# Altium footprint library Kon_Tipk.PCBLIB: 113 footprints (part 5 of 8)
Each footprint in its own frame and in the unit in brackets; x right, y up, seen from the top. Pads: shape width x height; smd on the part's side, far side on the other; paste and mask are expansions set on the pad; w line width, h text height; cw(c..) or ccw(c..) is an arc to the next point about the centre after c.
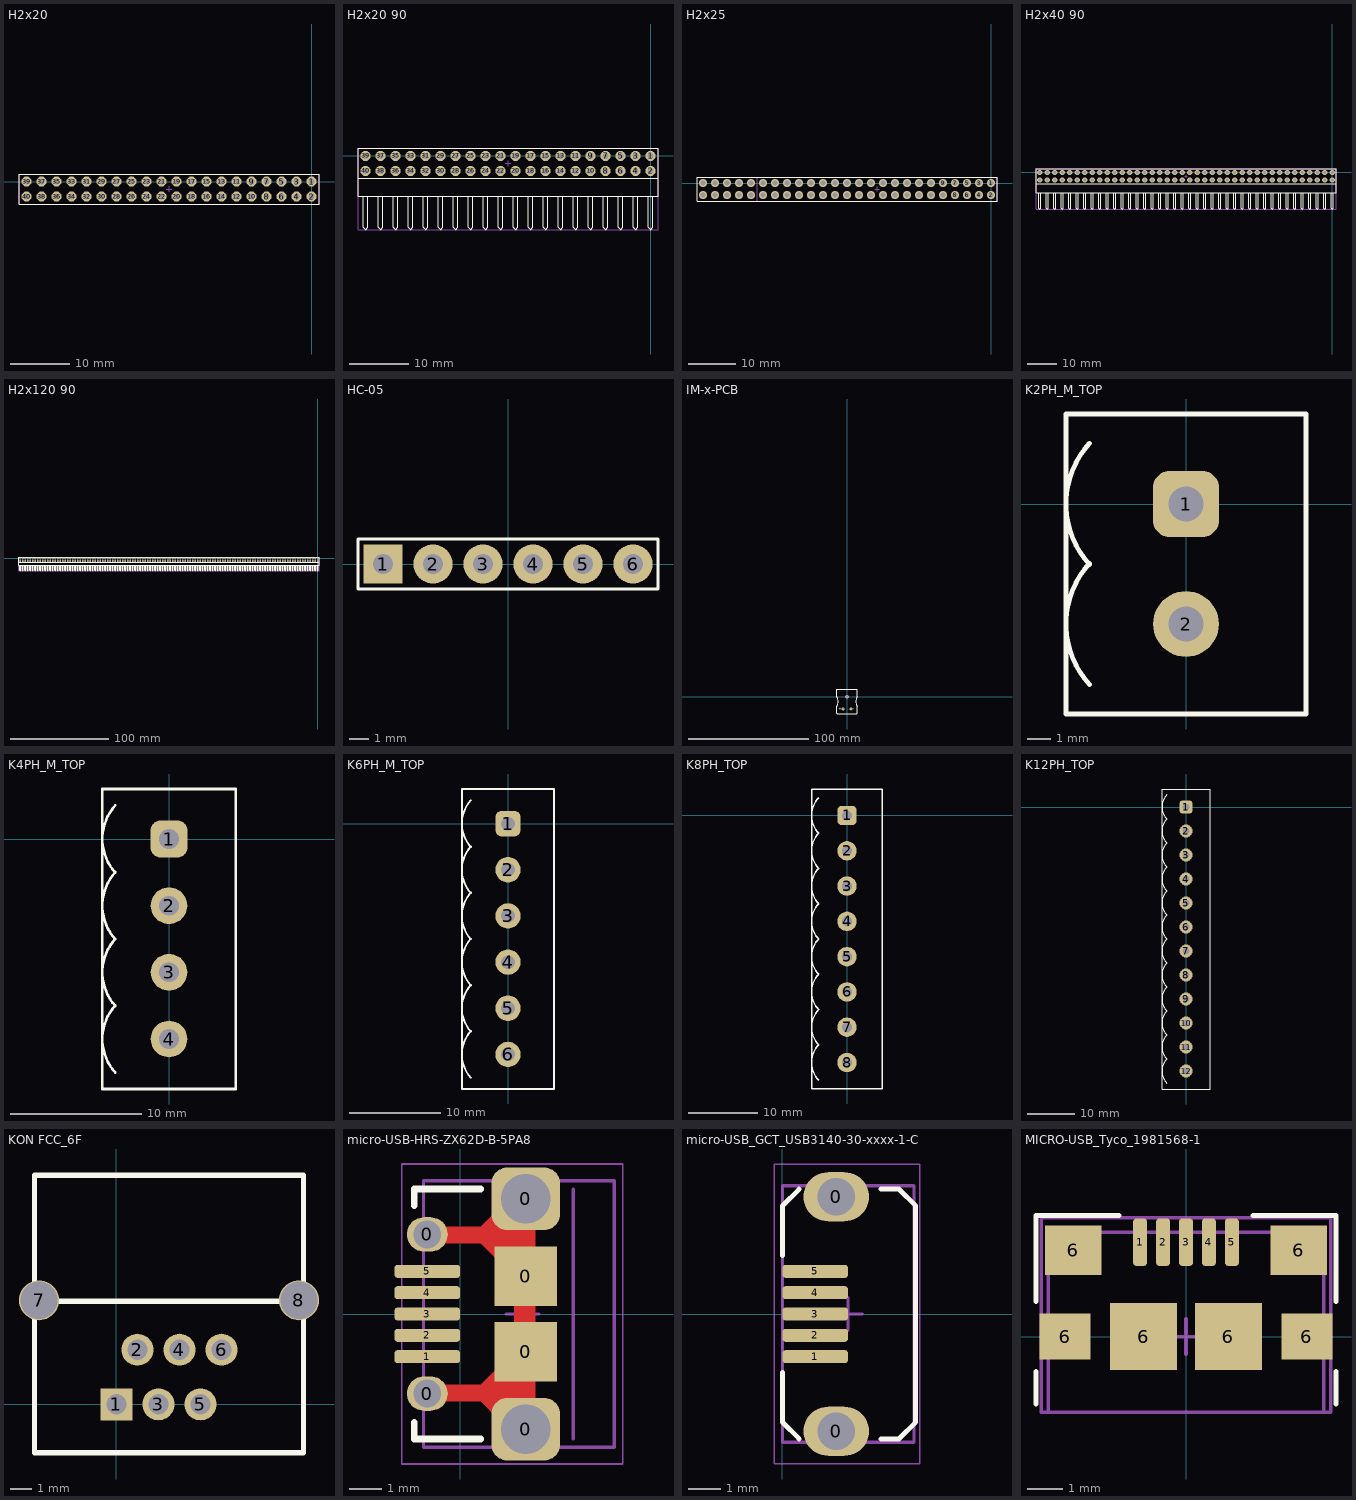
[diagram p4: the footprints below, top view; thin cyan lines are the x and y axes]

## H2x20 [mm]
height 8
pads (40):
  round 1.75 hole 1: 1(0,0) 2(0,-2.54) 3(-2.54,0) 4(-2.54,-2.54) 5(-5.08,0) 6(-5.08,-2.54) 7(-7.62,0) 8(-7.62,-2.54) 9(-10.16,0) 10(-10.16,-2.54) 11(-12.7,0) 12(-12.7,-2.54) 13(-15.24,0) 14(-15.24,-2.54) 15(-17.78,0) 16(-17.78,-2.54) 17(-20.32,0) 18(-20.32,-2.54) 19(-22.86,0) 20(-22.86,-2.54) 21(-25.4,0) 22(-25.4,-2.54) 23(-27.94,0) 24(-27.94,-2.54) 25(-30.48,0) 26(-30.48,-2.54) 27(-33.02,0) 28(-33.02,-2.54) 29(-35.56,0) 30(-35.56,-2.54) 31(-38.1,0) 32(-38.1,-2.54) 33(-40.64,0) 34(-40.64,-2.54) 35(-43.18,0) 36(-43.18,-2.54) 37(-45.72,0) 38(-45.72,-2.54) 39(-48.26,0) 40(-48.26,-2.54)
Top Overlay:
  lines w0.2: -49.53,-3.81 -49.53,1.27 1.27,1.27 1.27,-3.81 -49.53,-3.81
Mechanical 13:
  lines w0.1: -49.53,-3.81 -49.53,1.27 1.27,1.27 1.27,-3.81 -49.53,-3.81
Top Courtyard:
  lines w0.1: -24.63,-1.27 -23.63,-1.27 ; -24.13,-1.77 -24.13,-0.77 ; -49.53,-3.81 1.27,-3.81 1.27,1.27 -49.53,1.27 -49.53,-3.81
3D body "Samtec-TSW-101-07-G-D.step": height 8.4, standoff -2.52, extent -3.81,-3.81 -1.27,1.27
3D body "Samtec-TSW-101-07-G-D.step": height 8.4, standoff -2.52, extent -6.35,-3.81 -3.81,1.27
3D body "Samtec-TSW-101-07-G-D.step": height 8.4, standoff -2.52, extent -1.27,-3.81 1.27,1.27
3D body "Samtec-TSW-101-07-G-D.step": height 8.4, standoff -2.52, extent -8.89,-3.81 -6.35,1.27
3D body "Samtec-TSW-101-07-G-D.step": height 8.4, standoff -2.52, extent -11.43,-3.81 -8.89,1.27
3D body "Samtec-TSW-101-07-G-D.step": height 8.4, standoff -2.52, extent -13.97,-3.81 -11.43,1.27
3D body "Samtec-TSW-101-07-G-D.step": height 8.4, standoff -2.52, extent -16.51,-3.81 -13.97,1.27
3D body "Samtec-TSW-101-07-G-D.step": height 8.4, standoff -2.52, extent -19.05,-3.81 -16.51,1.27
3D body "Samtec-TSW-101-07-G-D.step": height 8.4, standoff -2.52, extent -21.59,-3.81 -19.05,1.27
3D body "Samtec-TSW-101-07-G-D.step": height 8.4, standoff -2.52, extent -24.13,-3.81 -21.59,1.27
3D body "Samtec-TSW-101-07-G-D.step": height 8.4, standoff -2.52, extent -26.67,-3.81 -24.13,1.27
3D body "Samtec-TSW-101-07-G-D.step": height 8.4, standoff -2.52, extent -29.21,-3.81 -26.67,1.27
3D body "Samtec-TSW-101-07-G-D.step": height 8.4, standoff -2.52, extent -31.75,-3.81 -29.21,1.27
3D body "Samtec-TSW-101-07-G-D.step": height 8.4, standoff -2.52, extent -34.29,-3.81 -31.75,1.27
3D body "Samtec-TSW-101-07-G-D.step": height 8.4, standoff -2.52, extent -36.83,-3.81 -34.29,1.27
3D body "Samtec-TSW-101-07-G-D.step": height 8.4, standoff -2.52, extent -39.37,-3.81 -36.83,1.27
3D body "Samtec-TSW-101-07-G-D.step": height 8.4, standoff -2.52, extent -41.91,-3.81 -39.37,1.27
3D body "Samtec-TSW-101-07-G-D.step": height 8.4, standoff -2.52, extent -44.45,-3.81 -41.91,1.27
3D body "Samtec-TSW-101-07-G-D.step": height 8.4, standoff -2.52, extent -46.99,-3.81 -44.45,1.27
3D body "Samtec-TSW-101-07-G-D.step": height 8.4, standoff -2.52, extent -49.53,-3.81 -46.99,1.27

## H2x20 90 [mm]
height 8
pads (40):
  round 1.75 hole 1: 1(0,0) 2(0,-2.54) 3(-2.54,0) 4(-2.54,-2.54) 5(-5.08,0) 6(-5.08,-2.54) 7(-7.62,0) 8(-7.62,-2.54) 9(-10.16,0) 10(-10.16,-2.54) 11(-12.7,0) 12(-12.7,-2.54) 13(-15.24,0) 14(-15.24,-2.54) 15(-17.78,0) 16(-17.78,-2.54) 17(-20.32,0) 18(-20.32,-2.54) 19(-22.86,0) 20(-22.86,-2.54) 21(-25.4,0) 22(-25.4,-2.54) 23(-27.94,0) 24(-27.94,-2.54) 25(-30.48,0) 26(-30.48,-2.54) 27(-33.02,0) 28(-33.02,-2.54) 29(-35.56,0) 30(-35.56,-2.54) 31(-38.1,0) 32(-38.1,-2.54) 33(-40.64,0) 34(-40.64,-2.54) 35(-43.18,0) 36(-43.18,-2.54) 37(-45.72,0) 38(-45.72,-2.54) 39(-48.26,0) 40(-48.26,-2.54)
Top Overlay:
  lines w0.2: -49.53,-3.81 1.27,-3.81 ; -48.641,-6.858 -48.641,-12.078 -48.26,-12.459 -47.879,-12.078 -47.879,-6.858 ; -46.101,-6.858 -46.101,-12.078 -45.72,-12.459 -45.339,-12.078 -45.339,-6.858 ; -43.561,-6.858 -43.561,-12.078 -43.18,-12.459 -42.799,-12.078 -42.799,-6.858 ; -41.021,-6.858 -41.021,-12.078 -40.64,-12.459 -40.259,-12.078 -40.259,-6.858 ; -38.481,-6.858 -38.481,-12.078 -38.1,-12.459 -37.719,-12.078 -37.719,-6.858 ; -35.941,-6.858 -35.941,-12.078 -35.56,-12.459 -35.179,-12.078 -35.179,-6.858 ; -33.401,-6.858 -33.401,-12.078 -33.02,-12.459 -32.639,-12.078 -32.639,-6.858 ; -30.861,-6.858 -30.861,-12.078 -30.48,-12.459 -30.099,-12.078 -30.099,-6.858 ; -28.321,-6.858 -28.321,-12.078 -27.94,-12.459 -27.559,-12.078 -27.559,-6.858 ; -25.781,-6.858 -25.781,-12.078 -25.4,-12.459 -25.019,-12.078 -25.019,-6.858 ; -23.241,-6.858 -23.241,-12.078 -22.86,-12.459 -22.479,-12.078 -22.479,-6.858 ; -20.701,-6.858 -20.701,-12.078 -20.32,-12.459 -19.939,-12.078 -19.939,-6.858 ; -18.161,-6.858 -18.161,-12.078 -17.78,-12.459 -17.399,-12.078 -17.399,-6.858 ; -15.621,-6.858 -15.621,-12.078 -15.24,-12.459 -14.859,-12.078 -14.859,-6.858 ; -13.081,-6.858 -13.081,-12.078 -12.7,-12.459 -12.319,-12.078 -12.319,-6.858 ; -10.541,-6.858 -10.541,-12.078 -10.16,-12.459 -9.779,-12.078 -9.779,-6.858 ; -8.001,-6.858 -8.001,-12.078 -7.62,-12.459 -7.239,-12.078 -7.239,-6.858 ; -5.461,-6.858 -5.461,-12.078 -5.08,-12.459 -4.699,-12.078 -4.699,-6.858 ; -2.921,-6.858 -2.921,-12.078 -2.54,-12.459 -2.159,-12.078 -2.159,-6.858 ; -0.381,-6.858 -0.381,-12.078 0,-12.459 0.381,-12.078 0.381,-6.858 ; -49.53,-6.858 1.27,-6.858 1.27,1.27 -49.53,1.27 -49.53,-6.858
Mechanical 13:
  lines w0.1: -49.53,-12.459 1.27,-12.459 1.27,1.27 -49.53,1.27 -49.53,-12.459
Top Courtyard:
  lines w0.1: -24.63,-1.27 -23.63,-1.27 ; -24.13,-1.77 -24.13,-0.77 ; -49.53,-12.459 1.27,-12.459 1.27,1.27 -49.53,1.27 -49.53,-12.459
3D body "Samtec-TSW-101-08-G-D-RA.step": height 5.6, standoff -2.27, extent -3.81,-12.459 -1.27,0.305
3D body "Samtec-TSW-101-08-G-D-RA.step": height 5.6, standoff -2.27, extent -1.27,-12.459 1.27,0.305
3D body "Samtec-TSW-101-08-G-D-RA.step": height 5.6, standoff -2.27, extent -6.35,-12.459 -3.81,0.305
3D body "Samtec-TSW-101-08-G-D-RA.step": height 5.6, standoff -2.27, extent -8.89,-12.459 -6.35,0.305
3D body "Samtec-TSW-101-08-G-D-RA.step": height 5.6, standoff -2.27, extent -11.43,-12.459 -8.89,0.305
3D body "Samtec-TSW-101-08-G-D-RA.step": height 5.6, standoff -2.27, extent -13.97,-12.459 -11.43,0.305
3D body "Samtec-TSW-101-08-G-D-RA.step": height 5.6, standoff -2.27, extent -16.51,-12.459 -13.97,0.305
3D body "Samtec-TSW-101-08-G-D-RA.step": height 5.6, standoff -2.27, extent -19.05,-12.459 -16.51,0.305
3D body "Samtec-TSW-101-08-G-D-RA.step": height 5.6, standoff -2.27, extent -21.59,-12.459 -19.05,0.305
3D body "Samtec-TSW-101-08-G-D-RA.step": height 5.6, standoff -2.27, extent -24.13,-12.459 -21.59,0.305
3D body "Samtec-TSW-101-08-G-D-RA.step": height 5.6, standoff -2.27, extent -26.67,-12.459 -24.13,0.305
3D body "Samtec-TSW-101-08-G-D-RA.step": height 5.6, standoff -2.27, extent -29.21,-12.459 -26.67,0.305
3D body "Samtec-TSW-101-08-G-D-RA.step": height 5.6, standoff -2.27, extent -31.75,-12.459 -29.21,0.305
3D body "Samtec-TSW-101-08-G-D-RA.step": height 5.6, standoff -2.27, extent -34.29,-12.459 -31.75,0.305
3D body "Samtec-TSW-101-08-G-D-RA.step": height 5.6, standoff -2.27, extent -36.83,-12.459 -34.29,0.305
3D body "Samtec-TSW-101-08-G-D-RA.step": height 5.6, standoff -2.27, extent -39.37,-12.459 -36.83,0.305
3D body "Samtec-TSW-101-08-G-D-RA.step": height 5.6, standoff -2.27, extent -41.91,-12.459 -39.37,0.305
3D body "Samtec-TSW-101-08-G-D-RA.step": height 5.6, standoff -2.27, extent -44.45,-12.459 -41.91,0.305
3D body "Samtec-TSW-101-08-G-D-RA.step": height 5.6, standoff -2.27, extent -46.99,-12.459 -44.45,0.305
3D body "Samtec-TSW-101-08-G-D-RA.step": height 5.6, standoff -2.27, extent -49.53,-12.459 -46.99,0.305

## H2x25 [mm]
height 8
pads (50):
  round 1.75 hole 1: 1(0,0) 2(0,-2.54) 3(-2.54,0) 4(-2.54,-2.54) 5(-5.08,0) 6(-5.08,-2.54) 7(-7.62,0) 8(-7.62,-2.54) 9(-10.16,0) 10(-10.16,-2.54) 11(-12.7,0) 12(-12.7,-2.54) 13(-15.24,0) 14(-15.24,-2.54) 15(-17.78,0) 16(-17.78,-2.54) 17(-20.32,0) 18(-20.32,-2.54) 19(-22.86,0) 20(-22.86,-2.54) 21(-25.4,0) 22(-25.4,-2.54) 23(-27.94,0) 24(-27.94,-2.54) 25(-30.48,0) 26(-30.48,-2.54) 27(-33.02,0) 28(-33.02,-2.54) 29(-35.56,0) 30(-35.56,-2.54) 31(-38.1,0) 32(-38.1,-2.54) 33(-40.64,0) 34(-40.64,-2.54) 35(-43.18,0) 36(-43.18,-2.54) 37(-45.72,0) 38(-45.72,-2.54) 39(-48.26,0) 40(-48.26,-2.54) 41(-50.8,0) 42(-50.8,-2.54) 43(-53.34,0) 44(-53.34,-2.54) 45(-55.88,0) 46(-55.88,-2.54) 47(-58.42,0) 48(-58.42,-2.54) 49(-60.96,0) 50(-60.96,-2.54)
Top Overlay:
  lines w0.2: -62.23,-3.81 -62.23,1.27 1.27,1.27 1.27,-3.81 -62.23,-3.81
Mechanical 13:
  lines w0.1: -49.53,-3.81 -49.53,1.27 1.27,1.27 1.27,-3.81 -49.53,-3.81
Top Courtyard:
  lines w0.1: -24.63,-1.27 -23.63,-1.27 ; -24.13,-1.77 -24.13,-0.77 ; -49.53,-3.81 1.27,-3.81 1.27,1.27 -49.53,1.27 -49.53,-3.81
3D body "Samtec-TSW-101-07-G-D.step": height 8.4, standoff -2.52, extent -62.23,-3.81 -59.69,1.27
3D body "Samtec-TSW-101-07-G-D.step": height 8.4, standoff -2.52, extent -59.69,-3.81 -57.15,1.27
3D body "Samtec-TSW-101-07-G-D.step": height 8.4, standoff -2.52, extent -57.15,-3.81 -54.61,1.27
3D body "Samtec-TSW-101-07-G-D.step": height 8.4, standoff -2.52, extent -54.61,-3.81 -52.07,1.27
3D body "Samtec-TSW-101-07-G-D.step": height 8.4, standoff -2.52, extent -52.07,-3.81 -49.53,1.27
3D body "Samtec-TSW-101-07-G-D.step": height 8.4, standoff -2.52, extent -3.81,-3.81 -1.27,1.27
3D body "Samtec-TSW-101-07-G-D.step": height 8.4, standoff -2.52, extent -6.35,-3.81 -3.81,1.27
3D body "Samtec-TSW-101-07-G-D.step": height 8.4, standoff -2.52, extent -1.27,-3.81 1.27,1.27
3D body "Samtec-TSW-101-07-G-D.step": height 8.4, standoff -2.52, extent -8.89,-3.81 -6.35,1.27
3D body "Samtec-TSW-101-07-G-D.step": height 8.4, standoff -2.52, extent -11.43,-3.81 -8.89,1.27
3D body "Samtec-TSW-101-07-G-D.step": height 8.4, standoff -2.52, extent -13.97,-3.81 -11.43,1.27
3D body "Samtec-TSW-101-07-G-D.step": height 8.4, standoff -2.52, extent -16.51,-3.81 -13.97,1.27
3D body "Samtec-TSW-101-07-G-D.step": height 8.4, standoff -2.52, extent -19.05,-3.81 -16.51,1.27
3D body "Samtec-TSW-101-07-G-D.step": height 8.4, standoff -2.52, extent -21.59,-3.81 -19.05,1.27
3D body "Samtec-TSW-101-07-G-D.step": height 8.4, standoff -2.52, extent -24.13,-3.81 -21.59,1.27
3D body "Samtec-TSW-101-07-G-D.step": height 8.4, standoff -2.52, extent -26.67,-3.81 -24.13,1.27
3D body "Samtec-TSW-101-07-G-D.step": height 8.4, standoff -2.52, extent -29.21,-3.81 -26.67,1.27
3D body "Samtec-TSW-101-07-G-D.step": height 8.4, standoff -2.52, extent -31.75,-3.81 -29.21,1.27
3D body "Samtec-TSW-101-07-G-D.step": height 8.4, standoff -2.52, extent -34.29,-3.81 -31.75,1.27
3D body "Samtec-TSW-101-07-G-D.step": height 8.4, standoff -2.52, extent -36.83,-3.81 -34.29,1.27
3D body "Samtec-TSW-101-07-G-D.step": height 8.4, standoff -2.52, extent -39.37,-3.81 -36.83,1.27
3D body "Samtec-TSW-101-07-G-D.step": height 8.4, standoff -2.52, extent -41.91,-3.81 -39.37,1.27
3D body "Samtec-TSW-101-07-G-D.step": height 8.4, standoff -2.52, extent -44.45,-3.81 -41.91,1.27
3D body "Samtec-TSW-101-07-G-D.step": height 8.4, standoff -2.52, extent -46.99,-3.81 -44.45,1.27
3D body "Samtec-TSW-101-07-G-D.step": height 8.4, standoff -2.52, extent -49.53,-3.81 -46.99,1.27

## H2x40 90 [mm]
height 8
pads (80):
  round 1.75 hole 1: 1(0,0) 2(0,-2.54) 3(-2.54,0) 4(-2.54,-2.54) 5(-5.08,0) 6(-5.08,-2.54) 7(-7.62,0) 8(-7.62,-2.54) 9(-10.16,0) 10(-10.16,-2.54) 11(-12.7,0) 12(-12.7,-2.54) 13(-15.24,0) 14(-15.24,-2.54) 15(-17.78,0) 16(-17.78,-2.54) 17(-20.32,0) 18(-20.32,-2.54) 19(-22.86,0) 20(-22.86,-2.54) 21(-25.4,0) 22(-25.4,-2.54) 23(-27.94,0) 24(-27.94,-2.54) 25(-30.48,0) 26(-30.48,-2.54) 27(-33.02,0) 28(-33.02,-2.54) 29(-35.56,0) 30(-35.56,-2.54) 31(-38.1,0) 32(-38.1,-2.54) 33(-40.64,0) 34(-40.64,-2.54) 35(-43.18,0) 36(-43.18,-2.54) 37(-45.72,0) 38(-45.72,-2.54) 39(-48.26,0) 40(-48.26,-2.54) 41(-50.8,0) 42(-50.8,-2.54) 43(-53.34,0) 44(-53.34,-2.54) 45(-55.88,0) 46(-55.88,-2.54) 47(-58.42,0) 48(-58.42,-2.54) 49(-60.96,0) 50(-60.96,-2.54) 51(-63.5,0) 52(-63.5,-2.54) 53(-66.04,0) 54(-66.04,-2.54) 55(-68.58,0) 56(-68.58,-2.54) 57(-71.12,0) 58(-71.12,-2.54) 59(-73.66,0) 60(-73.66,-2.54) 61(-76.2,0) 62(-76.2,-2.54) 63(-78.74,0) 64(-78.74,-2.54) 65(-81.28,0) 66(-81.28,-2.54) 67(-83.82,0) 68(-83.82,-2.54) 69(-86.36,0) 70(-86.36,-2.54) 71(-88.9,0) 72(-88.9,-2.54) 73(-91.44,0) 74(-91.44,-2.54) 75(-93.98,0) 76(-93.98,-2.54) 77(-96.52,0) 78(-96.52,-2.54) 79(-99.06,0) 80(-99.06,-2.54)
Top Overlay:
  drawing of 165 lines, arcs and shapes, not listed
Mechanical 13:
  lines w0.1: -100.33,-12.459 1.27,-12.459 1.27,1.27 -100.33,1.27 -100.33,-12.459
Top Courtyard:
  lines w0.1: -50.03,-1.27 -49.03,-1.27 ; -49.53,-1.77 -49.53,-0.77 ; -100.33,-12.459 1.27,-12.459 1.27,1.27 -100.33,1.27 -100.33,-12.459
3D body "Samtec-TSW-101-08-G-D-RA.step": height 5.6, standoff -2.27, extent -3.81,-12.459 -1.27,0.305
3D body "Samtec-TSW-101-08-G-D-RA.step": height 5.6, standoff -2.27, extent -1.27,-12.459 1.27,0.305
3D body "Samtec-TSW-101-08-G-D-RA.step": height 5.6, standoff -2.27, extent -6.35,-12.459 -3.81,0.305
3D body "Samtec-TSW-101-08-G-D-RA.step": height 5.6, standoff -2.27, extent -8.89,-12.459 -6.35,0.305
3D body "Samtec-TSW-101-08-G-D-RA.step": height 5.6, standoff -2.27, extent -11.43,-12.459 -8.89,0.305
3D body "Samtec-TSW-101-08-G-D-RA.step": height 5.6, standoff -2.27, extent -13.97,-12.459 -11.43,0.305
3D body "Samtec-TSW-101-08-G-D-RA.step": height 5.6, standoff -2.27, extent -16.51,-12.459 -13.97,0.305
3D body "Samtec-TSW-101-08-G-D-RA.step": height 5.6, standoff -2.27, extent -19.05,-12.459 -16.51,0.305
3D body "Samtec-TSW-101-08-G-D-RA.step": height 5.6, standoff -2.27, extent -21.59,-12.459 -19.05,0.305
3D body "Samtec-TSW-101-08-G-D-RA.step": height 5.6, standoff -2.27, extent -24.13,-12.459 -21.59,0.305
3D body "Samtec-TSW-101-08-G-D-RA.step": height 5.6, standoff -2.27, extent -26.67,-12.459 -24.13,0.305
3D body "Samtec-TSW-101-08-G-D-RA.step": height 5.6, standoff -2.27, extent -29.21,-12.459 -26.67,0.305
3D body "Samtec-TSW-101-08-G-D-RA.step": height 5.6, standoff -2.27, extent -31.75,-12.459 -29.21,0.305
3D body "Samtec-TSW-101-08-G-D-RA.step": height 5.6, standoff -2.27, extent -34.29,-12.459 -31.75,0.305
3D body "Samtec-TSW-101-08-G-D-RA.step": height 5.6, standoff -2.27, extent -36.83,-12.459 -34.29,0.305
3D body "Samtec-TSW-101-08-G-D-RA.step": height 5.6, standoff -2.27, extent -39.37,-12.459 -36.83,0.305
3D body "Samtec-TSW-101-08-G-D-RA.step": height 5.6, standoff -2.27, extent -41.91,-12.459 -39.37,0.305
3D body "Samtec-TSW-101-08-G-D-RA.step": height 5.6, standoff -2.27, extent -44.45,-12.459 -41.91,0.305
3D body "Samtec-TSW-101-08-G-D-RA.step": height 5.6, standoff -2.27, extent -46.99,-12.459 -44.45,0.305
3D body "Samtec-TSW-101-08-G-D-RA.step": height 5.6, standoff -2.27, extent -49.53,-12.459 -46.99,0.305
3D body "Samtec-TSW-101-08-G-D-RA.step": height 5.6, standoff -2.27, extent -52.07,-12.459 -49.53,0.305
3D body "Samtec-TSW-101-08-G-D-RA.step": height 5.6, standoff -2.27, extent -54.61,-12.459 -52.07,0.305
3D body "Samtec-TSW-101-08-G-D-RA.step": height 5.6, standoff -2.27, extent -57.15,-12.459 -54.61,0.305
3D body "Samtec-TSW-101-08-G-D-RA.step": height 5.6, standoff -2.27, extent -59.69,-12.459 -57.15,0.305
3D body "Samtec-TSW-101-08-G-D-RA.step": height 5.6, standoff -2.27, extent -62.23,-12.459 -59.69,0.305
3D body "Samtec-TSW-101-08-G-D-RA.step": height 5.6, standoff -2.27, extent -64.77,-12.459 -62.23,0.305
3D body "Samtec-TSW-101-08-G-D-RA.step": height 5.6, standoff -2.27, extent -67.31,-12.459 -64.77,0.305
3D body "Samtec-TSW-101-08-G-D-RA.step": height 5.6, standoff -2.27, extent -69.85,-12.459 -67.31,0.305
3D body "Samtec-TSW-101-08-G-D-RA.step": height 5.6, standoff -2.27, extent -72.39,-12.459 -69.85,0.305
3D body "Samtec-TSW-101-08-G-D-RA.step": height 5.6, standoff -2.27, extent -74.93,-12.459 -72.39,0.305
3D body "Samtec-TSW-101-08-G-D-RA.step": height 5.6, standoff -2.27, extent -77.47,-12.459 -74.93,0.305
3D body "Samtec-TSW-101-08-G-D-RA.step": height 5.6, standoff -2.27, extent -80.01,-12.459 -77.47,0.305
3D body "Samtec-TSW-101-08-G-D-RA.step": height 5.6, standoff -2.27, extent -82.55,-12.459 -80.01,0.305
3D body "Samtec-TSW-101-08-G-D-RA.step": height 5.6, standoff -2.27, extent -85.09,-12.459 -82.55,0.305
3D body "Samtec-TSW-101-08-G-D-RA.step": height 5.6, standoff -2.27, extent -87.63,-12.459 -85.09,0.305
3D body "Samtec-TSW-101-08-G-D-RA.step": height 5.6, standoff -2.27, extent -90.17,-12.459 -87.63,0.305
3D body "Samtec-TSW-101-08-G-D-RA.step": height 5.6, standoff -2.27, extent -92.71,-12.459 -90.17,0.305
3D body "Samtec-TSW-101-08-G-D-RA.step": height 5.6, standoff -2.27, extent -95.25,-12.459 -92.71,0.305
3D body "Samtec-TSW-101-08-G-D-RA.step": height 5.6, standoff -2.27, extent -97.79,-12.459 -95.25,0.305
3D body "Samtec-TSW-101-08-G-D-RA.step": height 5.6, standoff -2.27, extent -100.33,-12.459 -97.79,0.305

## H2x120 90 [mm]
height 8
pads (240):
  round 1.75 hole 1: 1(0,0) 2(0,-2.54) 3(-2.54,0) 4(-2.54,-2.54) 5(-5.08,0) 6(-5.08,-2.54) 7(-7.62,0) 8(-7.62,-2.54) 9(-10.16,0) 10(-10.16,-2.54) 11(-12.7,0) 12(-12.7,-2.54) 13(-15.24,0) 14(-15.24,-2.54) 15(-17.78,0) 16(-17.78,-2.54) 17(-20.32,0) 18(-20.32,-2.54) 19(-22.86,0) 20(-22.86,-2.54) 21(-25.4,0) 22(-25.4,-2.54) 23(-27.94,0) 24(-27.94,-2.54) 25(-30.48,0) 26(-30.48,-2.54) 27(-33.02,0) 28(-33.02,-2.54) 29(-35.56,0) 30(-35.56,-2.54) 31(-38.1,0) 32(-38.1,-2.54) 33(-40.64,0) 34(-40.64,-2.54) 35(-43.18,0) 36(-43.18,-2.54) 37(-45.72,0) 38(-45.72,-2.54) 39(-48.26,0) 40(-48.26,-2.54) 41(-50.8,0) 42(-50.8,-2.54) 43(-53.34,0) 44(-53.34,-2.54) 45(-55.88,0) 46(-55.88,-2.54) 47(-58.42,0) 48(-58.42,-2.54) 49(-60.96,0) 50(-60.96,-2.54) 51(-63.5,0) 52(-63.5,-2.54) 53(-66.04,0) 54(-66.04,-2.54) 55(-68.58,0) 56(-68.58,-2.54) 57(-71.12,0) 58(-71.12,-2.54) 59(-73.66,0) 60(-73.66,-2.54) 61(-76.2,0) 62(-76.2,-2.54) 63(-78.74,0) 64(-78.74,-2.54) 65(-81.28,0) 66(-81.28,-2.54) 67(-83.82,0) 68(-83.82,-2.54) 69(-86.36,0) 70(-86.36,-2.54) 71(-88.9,0) 72(-88.9,-2.54) 73(-91.44,0) 74(-91.44,-2.54) 75(-93.98,0) 76(-93.98,-2.54) 77(-96.52,0) 78(-96.52,-2.54) 79(-99.06,0) 80(-99.06,-2.54) 81(-101.6,0) 82(-101.6,-2.54) 83(-104.14,0) 84(-104.14,-2.54) 85(-106.68,0) 86(-106.68,-2.54) 87(-109.22,0) 88(-109.22,-2.54) 89(-111.76,0) 90(-111.76,-2.54) 91(-114.3,0) 92(-114.3,-2.54) 93(-116.84,0) 94(-116.84,-2.54) 95(-119.38,0) 96(-119.38,-2.54) 97(-121.92,0) 98(-121.92,-2.54) 99(-124.46,0) 100(-124.46,-2.54) 101(-127,0) 102(-127,-2.54) 103(-129.54,0) 104(-129.54,-2.54) 105(-132.08,0) 106(-132.08,-2.54) 107(-134.62,0) 108(-134.62,-2.54) 109(-137.16,0) 110(-137.16,-2.54) 111(-139.7,0) 112(-139.7,-2.54) 113(-142.24,0) 114(-142.24,-2.54) 115(-144.78,0) 116(-144.78,-2.54) 117(-147.32,0) 118(-147.32,-2.54) 119(-149.86,0) 120(-149.86,-2.54) 121(-152.4,0) 122(-152.4,-2.54) 123(-154.94,0) 124(-154.94,-2.54) 125(-157.48,0) 126(-157.48,-2.54) 127(-160.02,0) 128(-160.02,-2.54) 129(-162.56,0) 130(-162.56,-2.54) 131(-165.1,0) 132(-165.1,-2.54) 133(-167.64,0) 134(-167.64,-2.54) 135(-170.18,0) 136(-170.18,-2.54) 137(-172.72,0) 138(-172.72,-2.54) 139(-175.26,0) 140(-175.26,-2.54) 141(-177.8,0) 142(-177.8,-2.54) 143(-180.34,0) 144(-180.34,-2.54) 145(-182.88,0) 146(-182.88,-2.54) 147(-185.42,0) 148(-185.42,-2.54) 149(-187.96,0) 150(-187.96,-2.54) 151(-190.5,0) 152(-190.5,-2.54) 153(-193.04,0) 154(-193.04,-2.54) 155(-195.58,0) 156(-195.58,-2.54) 157(-198.12,0) 158(-198.12,-2.54) 159(-200.66,0) 160(-200.66,-2.54) 161(-203.2,0) 162(-203.2,-2.54) 163(-205.74,0) 164(-205.74,-2.54) 165(-208.28,0) 166(-208.28,-2.54) 167(-210.82,0) 168(-210.82,-2.54) 169(-213.36,0) 170(-213.36,-2.54) 171(-215.9,0) 172(-215.9,-2.54) 173(-218.44,0) 174(-218.44,-2.54) 175(-220.98,0) 176(-220.98,-2.54) 177(-223.52,0) 178(-223.52,-2.54) 179(-226.06,0) 180(-226.06,-2.54) 181(-228.6,0) 182(-228.6,-2.54) 183(-231.14,0) 184(-231.14,-2.54) 185(-233.68,0) 186(-233.68,-2.54) 187(-236.22,0) 188(-236.22,-2.54) 189(-238.76,0) 190(-238.76,-2.54) 191(-241.3,0) 192(-241.3,-2.54) 193(-243.84,0) 194(-243.84,-2.54) 195(-246.38,0) 196(-246.38,-2.54) 197(-248.92,0) 198(-248.92,-2.54) 199(-251.46,0) 200(-251.46,-2.54) 201(-254,0) 202(-254,-2.54) 203(-256.54,0) 204(-256.54,-2.54) 205(-259.08,0) 206(-259.08,-2.54) 207(-261.62,0) 208(-261.62,-2.54) 209(-264.16,0) 210(-264.16,-2.54) 211(-266.7,0) 212(-266.7,-2.54) 213(-269.24,0) 214(-269.24,-2.54) 215(-271.78,0) 216(-271.78,-2.54) 217(-274.32,0) 218(-274.32,-2.54) 219(-276.86,0) 220(-276.86,-2.54) 221(-279.4,0) 222(-279.4,-2.54) 223(-281.94,0) 224(-281.94,-2.54) 225(-284.48,0) 226(-284.48,-2.54) 227(-287.02,0) 228(-287.02,-2.54) 229(-289.56,0) 230(-289.56,-2.54) 231(-292.1,0) 232(-292.1,-2.54) 233(-294.64,0) 234(-294.64,-2.54) 235(-297.18,0) 236(-297.18,-2.54) 237(-299.72,0) 238(-299.72,-2.54) 239(-302.26,0) 240(-302.26,-2.54)
Top Overlay:
  drawing of 485 lines, arcs and shapes, not listed
Mechanical 13:
  lines w0.1: -303.53,-12.459 -303.53,1.27 1.27,1.27 1.27,-12.459 -303.53,-12.459
Top Courtyard:
  lines w0.1: -151.63,-1.27 -150.63,-1.27 ; -151.13,-1.77 -151.13,-0.77 ; -303.53,-12.459 -303.53,1.27 1.27,1.27 1.27,-12.459 -303.53,-12.459
3D body "Samtec-TSW-101-08-G-D-RA.step": height 5.6, standoff -2.27, extent -303.53,-12.459 -300.99,0.305
3D body "Samtec-TSW-101-08-G-D-RA.step": height 5.6, standoff -2.27, extent -300.99,-12.459 -298.45,0.305
3D body "Samtec-TSW-101-08-G-D-RA.step": height 5.6, standoff -2.27, extent -298.45,-12.459 -295.91,0.305
3D body "Samtec-TSW-101-08-G-D-RA.step": height 5.6, standoff -2.27, extent -295.91,-12.459 -293.37,0.305
3D body "Samtec-TSW-101-08-G-D-RA.step": height 5.6, standoff -2.27, extent -293.37,-12.459 -290.83,0.305
3D body "Samtec-TSW-101-08-G-D-RA.step": height 5.6, standoff -2.27, extent -290.83,-12.459 -288.29,0.305
3D body "Samtec-TSW-101-08-G-D-RA.step": height 5.6, standoff -2.27, extent -288.29,-12.459 -285.75,0.305
3D body "Samtec-TSW-101-08-G-D-RA.step": height 5.6, standoff -2.27, extent -285.75,-12.459 -283.21,0.305
3D body "Samtec-TSW-101-08-G-D-RA.step": height 5.6, standoff -2.27, extent -283.21,-12.459 -280.67,0.305
3D body "Samtec-TSW-101-08-G-D-RA.step": height 5.6, standoff -2.27, extent -280.67,-12.459 -278.13,0.305
3D body "Samtec-TSW-101-08-G-D-RA.step": height 5.6, standoff -2.27, extent -278.13,-12.459 -275.59,0.305
3D body "Samtec-TSW-101-08-G-D-RA.step": height 5.6, standoff -2.27, extent -275.59,-12.459 -273.05,0.305
3D body "Samtec-TSW-101-08-G-D-RA.step": height 5.6, standoff -2.27, extent -273.05,-12.459 -270.51,0.305
3D body "Samtec-TSW-101-08-G-D-RA.step": height 5.6, standoff -2.27, extent -270.51,-12.459 -267.97,0.305
3D body "Samtec-TSW-101-08-G-D-RA.step": height 5.6, standoff -2.27, extent -267.97,-12.459 -265.43,0.305
3D body "Samtec-TSW-101-08-G-D-RA.step": height 5.6, standoff -2.27, extent -265.43,-12.459 -262.89,0.305
3D body "Samtec-TSW-101-08-G-D-RA.step": height 5.6, standoff -2.27, extent -262.89,-12.459 -260.35,0.305
3D body "Samtec-TSW-101-08-G-D-RA.step": height 5.6, standoff -2.27, extent -260.35,-12.459 -257.81,0.305
3D body "Samtec-TSW-101-08-G-D-RA.step": height 5.6, standoff -2.27, extent -257.81,-12.459 -255.27,0.305
3D body "Samtec-TSW-101-08-G-D-RA.step": height 5.6, standoff -2.27, extent -255.27,-12.459 -252.73,0.305
3D body "Samtec-TSW-101-08-G-D-RA.step": height 5.6, standoff -2.27, extent -252.73,-12.459 -250.19,0.305
3D body "Samtec-TSW-101-08-G-D-RA.step": height 5.6, standoff -2.27, extent -250.19,-12.459 -247.65,0.305
3D body "Samtec-TSW-101-08-G-D-RA.step": height 5.6, standoff -2.27, extent -247.65,-12.459 -245.11,0.305
3D body "Samtec-TSW-101-08-G-D-RA.step": height 5.6, standoff -2.27, extent -245.11,-12.459 -242.57,0.305
3D body "Samtec-TSW-101-08-G-D-RA.step": height 5.6, standoff -2.27, extent -242.57,-12.459 -240.03,0.305
3D body "Samtec-TSW-101-08-G-D-RA.step": height 5.6, standoff -2.27, extent -240.03,-12.459 -237.49,0.305
3D body "Samtec-TSW-101-08-G-D-RA.step": height 5.6, standoff -2.27, extent -237.49,-12.459 -234.95,0.305
3D body "Samtec-TSW-101-08-G-D-RA.step": height 5.6, standoff -2.27, extent -234.95,-12.459 -232.41,0.305
3D body "Samtec-TSW-101-08-G-D-RA.step": height 5.6, standoff -2.27, extent -232.41,-12.459 -229.87,0.305
3D body "Samtec-TSW-101-08-G-D-RA.step": height 5.6, standoff -2.27, extent -229.87,-12.459 -227.33,0.305
3D body "Samtec-TSW-101-08-G-D-RA.step": height 5.6, standoff -2.27, extent -227.33,-12.459 -224.79,0.305
3D body "Samtec-TSW-101-08-G-D-RA.step": height 5.6, standoff -2.27, extent -224.79,-12.459 -222.25,0.305
3D body "Samtec-TSW-101-08-G-D-RA.step": height 5.6, standoff -2.27, extent -222.25,-12.459 -219.71,0.305
3D body "Samtec-TSW-101-08-G-D-RA.step": height 5.6, standoff -2.27, extent -219.71,-12.459 -217.17,0.305
3D body "Samtec-TSW-101-08-G-D-RA.step": height 5.6, standoff -2.27, extent -217.17,-12.459 -214.63,0.305
3D body "Samtec-TSW-101-08-G-D-RA.step": height 5.6, standoff -2.27, extent -214.63,-12.459 -212.09,0.305
3D body "Samtec-TSW-101-08-G-D-RA.step": height 5.6, standoff -2.27, extent -212.09,-12.459 -209.55,0.305
3D body "Samtec-TSW-101-08-G-D-RA.step": height 5.6, standoff -2.27, extent -209.55,-12.459 -207.01,0.305
3D body "Samtec-TSW-101-08-G-D-RA.step": height 5.6, standoff -2.27, extent -207.01,-12.459 -204.47,0.305
3D body "Samtec-TSW-101-08-G-D-RA.step": height 5.6, standoff -2.27, extent -204.47,-12.459 -201.93,0.305
3D body "Samtec-TSW-101-08-G-D-RA.step": height 5.6, standoff -2.27, extent -201.93,-12.459 -199.39,0.305
3D body "Samtec-TSW-101-08-G-D-RA.step": height 5.6, standoff -2.27, extent -199.39,-12.459 -196.85,0.305
3D body "Samtec-TSW-101-08-G-D-RA.step": height 5.6, standoff -2.27, extent -196.85,-12.459 -194.31,0.305
3D body "Samtec-TSW-101-08-G-D-RA.step": height 5.6, standoff -2.27, extent -194.31,-12.459 -191.77,0.305
3D body "Samtec-TSW-101-08-G-D-RA.step": height 5.6, standoff -2.27, extent -191.77,-12.459 -189.23,0.305
3D body "Samtec-TSW-101-08-G-D-RA.step": height 5.6, standoff -2.27, extent -189.23,-12.459 -186.69,0.305
3D body "Samtec-TSW-101-08-G-D-RA.step": height 5.6, standoff -2.27, extent -186.69,-12.459 -184.15,0.305
3D body "Samtec-TSW-101-08-G-D-RA.step": height 5.6, standoff -2.27, extent -184.15,-12.459 -181.61,0.305
3D body "Samtec-TSW-101-08-G-D-RA.step": height 5.6, standoff -2.27, extent -181.61,-12.459 -179.07,0.305
3D body "Samtec-TSW-101-08-G-D-RA.step": height 5.6, standoff -2.27, extent -179.07,-12.459 -176.53,0.305
3D body "Samtec-TSW-101-08-G-D-RA.step": height 5.6, standoff -2.27, extent -176.53,-12.459 -173.99,0.305
3D body "Samtec-TSW-101-08-G-D-RA.step": height 5.6, standoff -2.27, extent -173.99,-12.459 -171.45,0.305
3D body "Samtec-TSW-101-08-G-D-RA.step": height 5.6, standoff -2.27, extent -171.45,-12.459 -168.91,0.305
3D body "Samtec-TSW-101-08-G-D-RA.step": height 5.6, standoff -2.27, extent -168.91,-12.459 -166.37,0.305
3D body "Samtec-TSW-101-08-G-D-RA.step": height 5.6, standoff -2.27, extent -166.37,-12.459 -163.83,0.305
3D body "Samtec-TSW-101-08-G-D-RA.step": height 5.6, standoff -2.27, extent -163.83,-12.459 -161.29,0.305
3D body "Samtec-TSW-101-08-G-D-RA.step": height 5.6, standoff -2.27, extent -161.29,-12.459 -158.75,0.305
3D body "Samtec-TSW-101-08-G-D-RA.step": height 5.6, standoff -2.27, extent -158.75,-12.459 -156.21,0.305
3D body "Samtec-TSW-101-08-G-D-RA.step": height 5.6, standoff -2.27, extent -156.21,-12.459 -153.67,0.305
3D body "Samtec-TSW-101-08-G-D-RA.step": height 5.6, standoff -2.27, extent -153.67,-12.459 -151.13,0.305
3D body "Samtec-TSW-101-08-G-D-RA.step": height 5.6, standoff -2.27, extent -151.13,-12.459 -148.59,0.305
3D body "Samtec-TSW-101-08-G-D-RA.step": height 5.6, standoff -2.27, extent -148.59,-12.459 -146.05,0.305
3D body "Samtec-TSW-101-08-G-D-RA.step": height 5.6, standoff -2.27, extent -146.05,-12.459 -143.51,0.305
3D body "Samtec-TSW-101-08-G-D-RA.step": height 5.6, standoff -2.27, extent -143.51,-12.459 -140.97,0.305
3D body "Samtec-TSW-101-08-G-D-RA.step": height 5.6, standoff -2.27, extent -140.97,-12.459 -138.43,0.305
3D body "Samtec-TSW-101-08-G-D-RA.step": height 5.6, standoff -2.27, extent -138.43,-12.459 -135.89,0.305
3D body "Samtec-TSW-101-08-G-D-RA.step": height 5.6, standoff -2.27, extent -135.89,-12.459 -133.35,0.305
3D body "Samtec-TSW-101-08-G-D-RA.step": height 5.6, standoff -2.27, extent -133.35,-12.459 -130.81,0.305
3D body "Samtec-TSW-101-08-G-D-RA.step": height 5.6, standoff -2.27, extent -130.81,-12.459 -128.27,0.305
3D body "Samtec-TSW-101-08-G-D-RA.step": height 5.6, standoff -2.27, extent -128.27,-12.459 -125.73,0.305
3D body "Samtec-TSW-101-08-G-D-RA.step": height 5.6, standoff -2.27, extent -125.73,-12.459 -123.19,0.305
3D body "Samtec-TSW-101-08-G-D-RA.step": height 5.6, standoff -2.27, extent -123.19,-12.459 -120.65,0.305
3D body "Samtec-TSW-101-08-G-D-RA.step": height 5.6, standoff -2.27, extent -120.65,-12.459 -118.11,0.305
3D body "Samtec-TSW-101-08-G-D-RA.step": height 5.6, standoff -2.27, extent -118.11,-12.459 -115.57,0.305
3D body "Samtec-TSW-101-08-G-D-RA.step": height 5.6, standoff -2.27, extent -115.57,-12.459 -113.03,0.305
3D body "Samtec-TSW-101-08-G-D-RA.step": height 5.6, standoff -2.27, extent -113.03,-12.459 -110.49,0.305
3D body "Samtec-TSW-101-08-G-D-RA.step": height 5.6, standoff -2.27, extent -110.49,-12.459 -107.95,0.305
3D body "Samtec-TSW-101-08-G-D-RA.step": height 5.6, standoff -2.27, extent -107.95,-12.459 -105.41,0.305
3D body "Samtec-TSW-101-08-G-D-RA.step": height 5.6, standoff -2.27, extent -105.41,-12.459 -102.87,0.305
3D body "Samtec-TSW-101-08-G-D-RA.step": height 5.6, standoff -2.27, extent -102.87,-12.459 -100.33,0.305
3D body "Samtec-TSW-101-08-G-D-RA.step": height 5.6, standoff -2.27, extent -100.33,-12.459 -97.79,0.305
3D body "Samtec-TSW-101-08-G-D-RA.step": height 5.6, standoff -2.27, extent -97.79,-12.459 -95.25,0.305
3D body "Samtec-TSW-101-08-G-D-RA.step": height 5.6, standoff -2.27, extent -95.25,-12.459 -92.71,0.305
3D body "Samtec-TSW-101-08-G-D-RA.step": height 5.6, standoff -2.27, extent -92.71,-12.459 -90.17,0.305
3D body "Samtec-TSW-101-08-G-D-RA.step": height 5.6, standoff -2.27, extent -90.17,-12.459 -87.63,0.305
3D body "Samtec-TSW-101-08-G-D-RA.step": height 5.6, standoff -2.27, extent -87.63,-12.459 -85.09,0.305
3D body "Samtec-TSW-101-08-G-D-RA.step": height 5.6, standoff -2.27, extent -85.09,-12.459 -82.55,0.305
3D body "Samtec-TSW-101-08-G-D-RA.step": height 5.6, standoff -2.27, extent -82.55,-12.459 -80.01,0.305
3D body "Samtec-TSW-101-08-G-D-RA.step": height 5.6, standoff -2.27, extent -80.01,-12.459 -77.47,0.305
3D body "Samtec-TSW-101-08-G-D-RA.step": height 5.6, standoff -2.27, extent -77.47,-12.459 -74.93,0.305
3D body "Samtec-TSW-101-08-G-D-RA.step": height 5.6, standoff -2.27, extent -74.93,-12.459 -72.39,0.305
3D body "Samtec-TSW-101-08-G-D-RA.step": height 5.6, standoff -2.27, extent -72.39,-12.459 -69.85,0.305
3D body "Samtec-TSW-101-08-G-D-RA.step": height 5.6, standoff -2.27, extent -69.85,-12.459 -67.31,0.305
3D body "Samtec-TSW-101-08-G-D-RA.step": height 5.6, standoff -2.27, extent -67.31,-12.459 -64.77,0.305
3D body "Samtec-TSW-101-08-G-D-RA.step": height 5.6, standoff -2.27, extent -64.77,-12.459 -62.23,0.305
3D body "Samtec-TSW-101-08-G-D-RA.step": height 5.6, standoff -2.27, extent -62.23,-12.459 -59.69,0.305
3D body "Samtec-TSW-101-08-G-D-RA.step": height 5.6, standoff -2.27, extent -59.69,-12.459 -57.15,0.305
3D body "Samtec-TSW-101-08-G-D-RA.step": height 5.6, standoff -2.27, extent -57.15,-12.459 -54.61,0.305
3D body "Samtec-TSW-101-08-G-D-RA.step": height 5.6, standoff -2.27, extent -54.61,-12.459 -52.07,0.305
3D body "Samtec-TSW-101-08-G-D-RA.step": height 5.6, standoff -2.27, extent -52.07,-12.459 -49.53,0.305
3D body "Samtec-TSW-101-08-G-D-RA.step": height 5.6, standoff -2.27, extent -49.53,-12.459 -46.99,0.305
3D body "Samtec-TSW-101-08-G-D-RA.step": height 5.6, standoff -2.27, extent -46.99,-12.459 -44.45,0.305
3D body "Samtec-TSW-101-08-G-D-RA.step": height 5.6, standoff -2.27, extent -44.45,-12.459 -41.91,0.305
3D body "Samtec-TSW-101-08-G-D-RA.step": height 5.6, standoff -2.27, extent -41.91,-12.459 -39.37,0.305
3D body "Samtec-TSW-101-08-G-D-RA.step": height 5.6, standoff -2.27, extent -39.37,-12.459 -36.83,0.305
3D body "Samtec-TSW-101-08-G-D-RA.step": height 5.6, standoff -2.27, extent -36.83,-12.459 -34.29,0.305
3D body "Samtec-TSW-101-08-G-D-RA.step": height 5.6, standoff -2.27, extent -34.29,-12.459 -31.75,0.305
3D body "Samtec-TSW-101-08-G-D-RA.step": height 5.6, standoff -2.27, extent -31.75,-12.459 -29.21,0.305
3D body "Samtec-TSW-101-08-G-D-RA.step": height 5.6, standoff -2.27, extent -29.21,-12.459 -26.67,0.305
3D body "Samtec-TSW-101-08-G-D-RA.step": height 5.6, standoff -2.27, extent -26.67,-12.459 -24.13,0.305
3D body "Samtec-TSW-101-08-G-D-RA.step": height 5.6, standoff -2.27, extent -24.13,-12.459 -21.59,0.305
3D body "Samtec-TSW-101-08-G-D-RA.step": height 5.6, standoff -2.27, extent -21.59,-12.459 -19.05,0.305
3D body "Samtec-TSW-101-08-G-D-RA.step": height 5.6, standoff -2.27, extent -19.05,-12.459 -16.51,0.305
3D body "Samtec-TSW-101-08-G-D-RA.step": height 5.6, standoff -2.27, extent -16.51,-12.459 -13.97,0.305
3D body "Samtec-TSW-101-08-G-D-RA.step": height 5.6, standoff -2.27, extent -13.97,-12.459 -11.43,0.305
3D body "Samtec-TSW-101-08-G-D-RA.step": height 5.6, standoff -2.27, extent -11.43,-12.459 -8.89,0.305
3D body "Samtec-TSW-101-08-G-D-RA.step": height 5.6, standoff -2.27, extent -8.89,-12.459 -6.35,0.305
3D body "Samtec-TSW-101-08-G-D-RA.step": height 5.6, standoff -2.27, extent -6.35,-12.459 -3.81,0.305
3D body "Samtec-TSW-101-08-G-D-RA.step": height 5.6, standoff -2.27, extent -1.27,-12.459 1.27,0.305
3D body "Samtec-TSW-101-08-G-D-RA.step": height 5.6, standoff -2.27, extent -3.81,-12.459 -1.27,0.305

## HC-05 [mm] "Bluetooth HC-05 w Breakout board"
height 13
pads (6):
  rect 2x2 hole 1: 1(-6.35,0)
  round 2 hole 1: 2(-3.81,0) 3(-1.27,0) 4(1.27,0) 5(3.81,0) 6(6.35,0)
Top Overlay:
  lines w0.15: -7.62,-1.27 -7.62,1.27 7.62,1.27 7.62,-1.27 -7.62,-1.27
3D body "User Library-HC-06.step": height 15.5, standoff 9.4, extent -7.493,-6.516 7.507,36.234

## IM-x-PCB [mm]
pads (3):
  round 3 hole 2.6: 0(0,0)
  round 2.5 hole 1.4: 1(-3.3,-10.141) 2(3.3,-10.141)
Top Overlay:
  lines w0.254: -7.989,-14.135 ccw(c-0.002,109.986) 7.989,-14.134 8.3,-13.706 8.3,-8.006 cw(c16.137,-4.003) 8.3,0 8.3,6.109 -8.3,6.109 -8.3,0 cw(c-16.137,-4.003) -8.3,-8.006 -8.3,-13.706 -7.989,-14.134
  text "+" at -6.858,-11.176 h2
  text "-" at 5.08,-11.176 h2
3D body "User Library-IM-T-PCB.STEP": height 8.57, standoff -2.99, extent -8.3,-14.391 8.3,6.109

## K2PH_M_TOP [mil]
pads (2):
  rrect50% 110x110 hole 59: 1(0,0)
  round 110 hole 59: 2(0,-200)
Top Overlay:
  lines w8: -160.94,-300.95 cw(c-50,-200) -160.77,-98.85 ; -160.94,-100.95 cw(c-50,0) -160.77,101.15 ; -200,-350 -200,150 200,150 200,-350 -200,-350

## K4PH_M_TOP [mil]
pads (4):
  rrect50% 110x110 hole 59: 1(0,0)
  round 110 hole 59: 2(0,-200) 3(0,-400) 4(0,-600)
Top Overlay:
  lines w8: -160.94,-700.95 cw(c-50,-600) -160.77,-498.85 ; -160.94,-500.95 cw(c-50,-400) -160.77,-298.85 ; -160.94,-300.95 cw(c-50,-200) -160.77,-98.85 ; -160.94,-100.95 cw(c-50,0) -160.77,101.15 ; -200,-750 200,-750 200,150 -200,150 -200,-750

## K6PH_M_TOP [mil]
pads (6):
  rrect50% 110x110 hole 59: 1(0,0)
  round 110 hole 59: 2(0,-200) 3(0,-400) 4(0,-600) 5(0,-800) 6(0,-1000)
Top Overlay:
  lines w8: -160.94,-1100.95 cw(c-50,-1000) -160.77,-898.85 ; -160.94,-900.95 cw(c-50,-800) -160.77,-698.85 ; -160.94,-700.95 cw(c-50,-600) -160.77,-498.85 ; -160.94,-500.95 cw(c-50,-400) -160.77,-298.85 ; -160.94,-300.95 cw(c-50,-200) -160.77,-98.85 ; -160.94,-100.95 cw(c-50,0) -160.77,101.15 ; -200,-1150 -200,150 200,150 200,-1150 -200,-1150

## K8PH_TOP [mil]
pads (8):
  rrect50% 110x110 hole 59: 1(0,0)
  round 110 hole 59: 2(0,-200) 3(0,-400) 4(0,-600) 5(0,-800) 6(0,-1000) 7(0,-1200) 8(0,-1400)
Top Overlay:
  lines w8: -160.94,-1500.95 cw(c-50,-1400) -160.77,-1298.85 ; -160.94,-1300.95 cw(c-50,-1200) -160.77,-1098.85 ; -160.94,-1100.95 cw(c-50,-1000) -160.77,-898.85 ; -160.94,-900.95 cw(c-50,-800) -160.77,-698.85 ; -160.94,-700.95 cw(c-50,-600) -160.77,-498.85 ; -160.94,-500.95 cw(c-50,-400) -160.77,-298.85 ; -160.94,-300.95 cw(c-50,-200) -160.77,-98.85 ; -160.94,-100.95 cw(c-50,0) -160.77,101.15 ; -200,-1550 200,-1550 200,150 -200,150 -200,-1550

## K12PH_TOP [mil]
pads (12):
  rrect50% 110x110 hole 59: 1(0,0)
  round 110 hole 59: 2(0,-200) 3(0,-400) 4(0,-600) 5(0,-800) 6(0,-1000) 7(0,-1200) 8(0,-1400) 9(0,-1600) 10(0,-1800) 11(0,-2000) 12(0,-2200)
Top Overlay:
  lines w8: -160.94,-2300.95 cw(c-50,-2200) -160.77,-2098.85 ; -160.94,-2100.95 cw(c-50,-2000) -160.77,-1898.85 ; -160.94,-1900.95 cw(c-50,-1800) -160.77,-1698.85 ; -160.94,-1700.95 cw(c-50,-1600) -160.77,-1498.85 ; -160.94,-1500.95 cw(c-50,-1400) -160.77,-1298.85 ; -160.94,-1300.95 cw(c-50,-1200) -160.77,-1098.85 ; -160.94,-1100.95 cw(c-50,-1000) -160.77,-898.85 ; -160.94,-900.95 cw(c-50,-800) -160.77,-698.85 ; -160.94,-700.95 cw(c-50,-600) -160.77,-498.85 ; -160.94,-500.95 cw(c-50,-400) -160.77,-298.85 ; -160.94,-300.95 cw(c-50,-200) -160.77,-98.85 ; -160.94,-100.95 cw(c-50,0) -160.77,101.15 ; -200,-2350 200,-2350 200,150 -200,150 -200,-2350

## KON FCC_6F [mil]
pads (8):
  rect 60x60 hole 38: 1(0,0)
  round 60 hole 38: 2(39.37,102.36) 3(78.74,0) 4(118.11,102.36) 5(157.48,0) 6(196.85,102.36)
  round 75 hole 70: 7(-145,195) 8(342,195)
Top Overlay:
  lines w10: -153.54,192.91 350.39,192.91 ; -153.54,-90.55 -153.54,429.13 350.39,429.13 350.39,-90.55 -153.54,-90.55

## micro-USB-HRS-ZX62D-B-5PA8 [mm]
height 1.5
pads (11):
  rrect100% 1.25x1.05 hole 0.85: 0(-1,-2.425) 0(-1,2.425)
  rrect50% 2.1x1.9 hole 1.5: 0(2,-3.512) 0(2,3.512)
  rect 1.9x1.8 smd: 0(2,-1.15) 0(2,1.15)
  rrect50% 2x0.4 smd: 1(-1,-1.3) 2(-1,-0.65) 3(-1,0) 4(-1,0.65) 5(-1,1.3)
Top Layer:
  region: -1.016,-2.159 0.635,-2.159 1.651,-1.143 1.651,1.143 0.635,2.159 -1.016,2.159 -1.016,2.667 0.635,2.667 1.524,3.556 2.286,3.556 2.286,-3.556 1.524,-3.556 0.635,-2.667 -1.016,-2.667
Top Overlay:
  lines w0.2: -1.397,-3.302 -1.397,-3.81 0.635,-3.81 ; -1.397,3.302 -1.397,3.81 0.635,3.81
Top Solder:
  region: -2.032,1.397 -2.032,-1.397 0,-1.397 0,1.397
Mechanical 13:
  lines w0.1: 3.45,-3.81 3.45,3.81 ; -1.112,-4.064 4.699,-4.064 4.699,4.064 -1.112,4.064 -1.112,-4.064
Top Courtyard:
  lines w0.05: -1.778,-4.572 4.953,-4.572 4.953,4.572 -1.778,4.572 -1.778,-4.572
  lines w0.1: 1.405,0 2.405,0 ; 1.905,-0.5 1.905,0.5
3D body "User Library-MicroUSB-B_Molex_105017-0001.step": height 2.68, standoff -0.62, extent -1.112,-4.1 4.318,4.1

## micro-USB_GCT_USB3140-30-xxxx-1-C [mm] "microUSB B receptacle vertical SMD"
height 6.5
pads (7):
  rrect100% 2x1.5 hole 1.15: 0(1.64,-3.575) 0(1.64,3.575)
  rrect50% 2x0.4 smd: 1(1,-1.3) 2(1,-0.65) 3(1,0) 4(1,0.65) 5(1,1.3)
Top Overlay:
  lines w0.15: 0,-1.778 0,-3.302 0.508,-3.81 ; 0,1.778 0,3.302 0.508,3.81 ; 3,-3.81 3.556,-3.81 4.064,-3.302 4.064,3.302 3.556,3.81 3,3.81
Top Solder:
  region: 0,1.397 0,-1.397 2.032,-1.397 2.032,1.397
Mechanical 13:
  lines w0.1: 0,-3.912 0,3.912 4.013,3.912 4.013,-3.912 0,-3.912
Top Courtyard:
  lines w0.05: -0.254,-4.572 -0.254,4.572 4.191,4.572 4.191,-4.572 -0.254,-4.572
  lines w0.1: 1.563,0 2.437,0 ; 2,-0.5 2,0.5
3D body "USB3140-30-0170-1-X_revB.step": height 6.56, standoff -1.64, extent 0,-3.901 4,3.901

## MICRO-USB_Tyco_1981568-1 [mm] "Micro USB socket Tyco 1981568-1"
height 2.94
pads (11):
  rrect50% 0.4x1.35 smd: 1(-1.3,2.675) 2(-0.65,2.675) 3(0,2.675) 4(0.65,2.675) 5(1.3,2.675)
  rect 1.45x1.3 smd: 6(-3.425,0) 6(3.425,0)
  rect 1.6x1.4 smd: 6(-3.2,2.45) 6(3.2,2.45)
  rect 1.9x1.9 smd: 6(-1.2,0) 6(1.2,0)
Top Overlay:
  lines w0.15: -4.25,-1.905 -4.25,-1 ; -4.25,1 -4.25,3.429 -1.905,3.429 ; 1.905,3.429 4.25,3.429 4.25,1 ; 4.25,-1.905 4.25,-1
Top Solder:
  region: -1.4,3.4 1.4,3.4 1.4,2 -1.4,2
Mechanical 13:
  lines w0.1: -3.9,-2.15 3.9,-2.15 3.9,2.96 -3.9,2.96 -3.9,-2.15
Top Courtyard:
  lines w0.1: -0.5,0 0.5,0 ; 0,-0.5 0,0.5 ; -4.1,-2.15 4.1,-2.15 4.1,3.36 -4.1,3.36 -4.1,-2.15
3D body "c-1981568-1-g-3d.stp": height 2.79, standoff -0.29, extent -4,-2.667 4,2.933